# Altium footprint library mainLib.PcbLib: 169 footprints (part 8 of 11)
Each footprint in its own frame and in the unit in brackets; x right, y up, seen from the top. Pads: shape width x height; smd on the part's side, far side on the other; paste and mask are expansions set on the pad; w line width, h text height; cw(c..) or ccw(c..) is an arc to the next point about the centre after c.
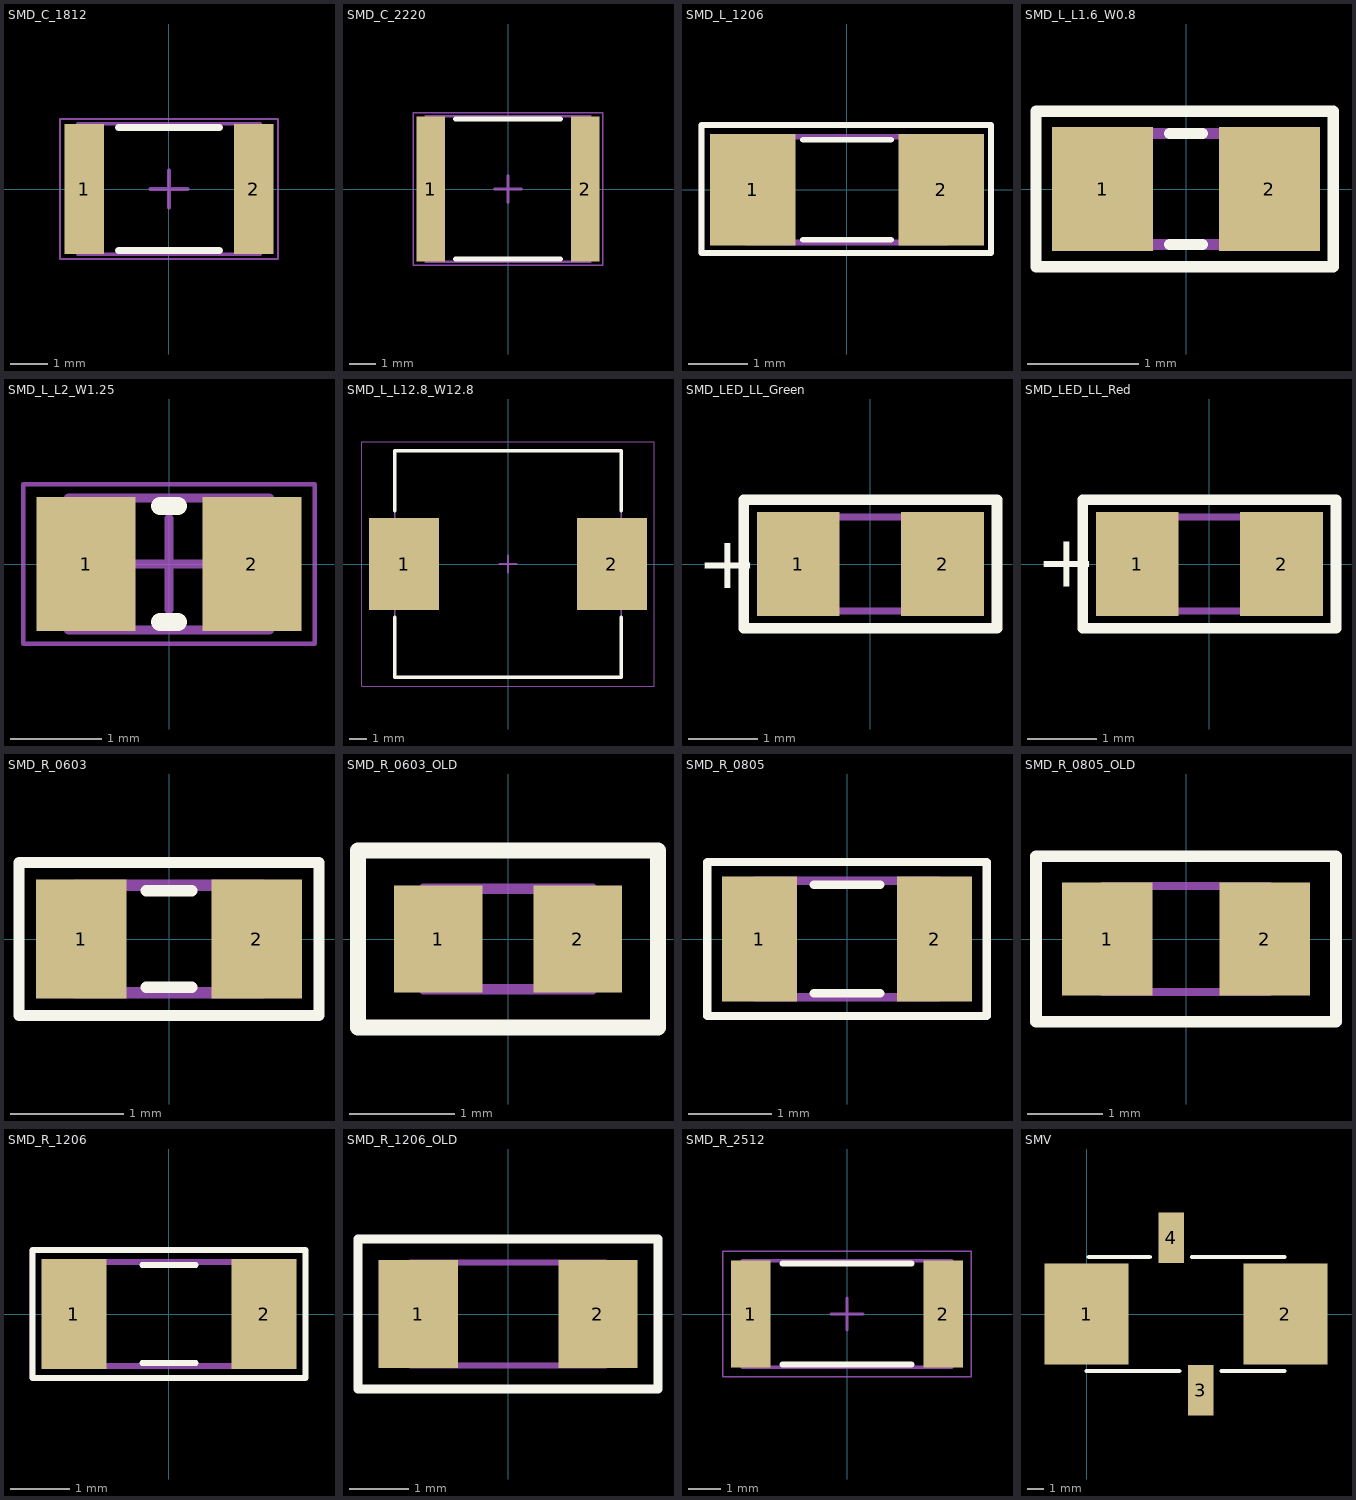
[diagram p7: the footprints below, top view; thin cyan lines are the x and y axes]

## SMD_C_1812 [mm] "Chip Capacitor, 2-Leads, Body 4,50x3,20mm, IPC Medium Density"
height 2
pads (2):
  rect 1.05x3.5 smd: 1(-2.275,0) 2(2.275,0)
Top Overlay:
  lines w0.2: -1.35,-1.65 1.35,-1.65 ; -1.35,1.65 1.35,1.65
Mechanical 13:
  lines w0.1: -2.45,-1.75 -2.45,1.75 2.45,1.75 2.45,-1.75 -2.45,-1.75
Mechanical 15:
  lines w0.05: -2.925,-1.875 -2.925,1.875 2.925,1.875 2.925,-1.875 -2.925,-1.875
  lines w0.1: -0.5,0 0.5,0 ; 0,-0.5 0,0.5
3D body "SMD_C_1812.step": height 2, standoff 0, extent -2.45,-1.75 2.45,1.75

## SMD_C_2220 [mm]
height 2
pads (2):
  rect 1.05x5.4 smd: 1(-2.875,0) 2(2.875,0)
Top Overlay:
  lines w0.2: -1.95,-2.6 1.95,-2.6 ; -1.95,2.6 1.95,2.6
Mechanical 13:
  lines w0.1: -3.05,-2.7 -3.05,2.7 3.05,2.7 3.05,-2.7 -3.05,-2.7
Mechanical 15:
  lines w0.05: -3.525,-2.825 -3.525,2.825 3.525,2.825 3.525,-2.825 -3.525,-2.825
  lines w0.1: -0.5,0 0.5,0 ; 0,-0.5 0,0.5
3D body "SMD_C_2220.step": height 2, standoff 0, extent -3.05,-2.7 3.05,2.7

## SMD_L_1206 [mm]
height 1.6
pads (2):
  rect 1.45x1.9 smd: 1(-1.6,0) 2(1.6,0)
Top Overlay:
  lines w0.1: -0.75,-0.85 0.75,-0.85 ; -0.75,0.85 0.75,0.85 ; -2.475,-1.075 -2.475,1.1 2.45,1.1 2.45,-1.075 -2.475,-1.075
Mechanical 13:
  lines w0.1: -1.7,-0.9 -1.7,0.9 1.7,0.9 1.7,-0.9 -1.7,-0.9
Mechanical 15:
  lines w0.05: -2.5,-1.075 -2.5,1.1 2.475,1.1 2.475,-1.075 -2.5,-1.075
3D body "SMD_C_1206.step": height 1.6, standoff 0, extent -1.7,-0.9 1.7,0.9

## SMD_L_L1.6_W0.8 [mm] "Chip Inductor, 2-Leads, Body 1,60x0,80mm, IPC Low Density"
height 0.8
pads (2):
  rect 0.91x1.12 smd: 1(-0.75,0) 2(0.75,0)
Top Overlay:
  lines w0.1: -0.15,-0.5 0.15,-0.5 ; -0.15,0.5 0.15,0.5 ; -1.35,-0.7 1.325,-0.7 1.325,0.7 -1.35,0.7 -1.35,-0.7
Mechanical 13:
  lines w0.1: -0.9,-0.5 -0.9,0.5 0.9,0.5 0.9,-0.5 -0.9,-0.5
Mechanical 15:
  lines w0.05: -1.35,-0.7 -1.35,0.7 1.35,0.7 1.35,-0.7 -1.35,-0.7
3D body: height 0.8, standoff 0, extent -0.55,-0.5 0.55,0.5
3D body: height 0.8, standoff 0, extent -0.9,-0.5 -0.55,0.5
3D body: height 0.8, standoff 0, extent 0.55,-0.5 0.9,0.5

## SMD_L_L2_W1.25 [mm]
height 0.85
pads (2):
  rect 1.09x1.47 smd: 1(-0.91,0) 2(0.91,0)
Top Overlay:
  lines w0.2: -0.1,-0.635 0.1,-0.635 ; -0.1,0.635 0.1,0.635
Mechanical 13:
  lines w0.1: -1.1,-0.725 -1.1,0.725 1.1,0.725 1.1,-0.725 -1.1,-0.725
Mechanical 15:
  lines w0.05: -1.6,-0.875 -1.6,0.875 1.6,0.875 1.6,-0.875 -1.6,-0.875
  lines w0.1: -0.5,0 0.5,0 ; 0,-0.5 0,0.5
3D body: height 0.85, standoff 0, extent -0.6,-0.725 0.6,0.725
3D body: height 0.85, standoff 0, extent -1.1,-0.725 -0.6,0.725
3D body: height 0.85, standoff 0, extent 0.6,-0.725 1.1,0.725

## SMD_L_L12.8_W12.8 [mil] "Precision Wire Wound Inductor, 2-Leads, Body 12,80x12,80mm, IPC Low Density"
height 314.96
pads (2):
  rect 155x205 smd: 1(-231.3,0) 2(231.3,0)
Top Overlay:
  lines w7.87: -251.97,-118.11 -251.97,-251.97 251.97,-251.97 251.97,-118.11 ; -251.97,118.11 -251.97,251.97 251.97,251.97 251.97,118.11
Mechanical 1:
  text "'.Designator'" at -253.94,290.35 h60
Mechanical 13:
  lines w3.94: -251.97,-251.97 251.97,-251.97 251.97,251.97 -251.97,251.97 -251.97,-251.97
Mechanical 15:
  lines w1.97: -325,-271.65 325,-271.65 325,271.65 -325,271.65 -325,-271.65
  lines w3.94: -19.68,0 19.69,0 ; 0,-19.68 0,19.68
3D body "INDP128128X80M.step": height 318.9, standoff 0, extent -255.91,-251.97 255.91,251.97

## SMD_LED_LL_Green [mil] "Chip Diode, 2-Leads, Body 2,00x1,25mm, IPC Low Density"
height 31.5
pads (2):
  rect 47x59 smd: 1(-41,0) 2(41,0)
Top Overlay:
  lines w6: -71.85,-36.42 -71.85,36.42 71.85,36.42 71.85,-36.42 -71.85,-36.42
  text "+" at -98.43,-13.78 h30
Mechanical 13:
  lines w3.94: -41.34,-26.57 -41.34,26.57 41.34,26.57 41.34,-26.57 -41.34,-26.57
3D body: height 31.5, standoff 0, extent -25.59,-26.57 25.59,26.58
3D body: height 31.5, standoff 0, extent -41.34,-26.57 -25.59,26.57
3D body: height 31.5, standoff 0, extent 25.59,-26.57 41.34,26.57

## SMD_LED_LL_Red [mil] "Chip Diode, 2-Leads, Body 2,00x1,25mm, IPC Low Density"
height 31.5
pads (2):
  rect 47x59 smd: 1(-41,0) 2(41,0)
Top Overlay:
  lines w6: -71.85,-36.42 -71.85,36.42 71.85,36.42 71.85,-36.42 -71.85,-36.42
  text "+" at -98.43,-12.8 h30
Mechanical 13:
  lines w3.94: -41.34,-26.57 -41.34,26.57 41.34,26.57 41.34,-26.57 -41.34,-26.57
3D body: height 31.5, standoff 0, extent -25.59,-26.57 25.59,26.58
3D body: height 31.5, standoff 0, extent -41.34,-26.57 -25.59,26.57
3D body: height 31.5, standoff 0, extent 25.59,-26.57 41.34,26.57

## SMD_R_0603 [mm]
height 0.5
pads (2):
  rect 0.8x1.05 smd: 1(-0.775,0) 2(0.775,0)
Top Overlay:
  lines w0.1: -0.2,-0.425 0.2,-0.425 ; -0.2,0.425 -0.1,0.425 0.1,0.425 0.2,0.425 ; -1.325,-0.675 1.325,-0.675 1.325,0.675 -1.325,0.675 -1.325,-0.675
Mechanical 13:
  lines w0.1: -0.825,-0.475 -0.825,0.475 0.825,0.475 0.825,-0.475 -0.825,-0.475
Mechanical 15:
  lines w0.05: -1.325,-0.675 -1.325,0.675 1.325,0.675 1.325,-0.675 -1.325,-0.675
3D body "SMD_R0603.step": height 0.5, standoff 0, extent -0.825,-0.475 0.825,0.475

## SMD_R_0603_OLD [mil] "Chip Resistor, 2-Leads, Body 1,55x0,85mm, IPC Low Density"
height 17.72
pads (2):
  rect 33x40 smd: 1(-26,0) 2(26,0)
Top Overlay:
  lines w6: -56,-33 56,-33 56,33 -56,33 -56,-33
Mechanical 13:
  lines w3.94: -31.5,-18.7 31.5,-18.7 31.5,18.7 -31.5,18.7 -31.5,-18.7
3D body "RESC1608X05M.step": height 17.72, standoff 0, extent -31.5,-18.7 31.5,18.7

## SMD_R_0805 [mm]
height 0.5
pads (2):
  rect 0.9x1.5 smd: 1(-1.05,0) 2(1.05,0)
Top Overlay:
  lines w0.1: -0.4,-0.65 0.4,-0.65 ; -0.4,0.65 0.4,0.65 ; -1.675,-0.925 1.675,-0.925 1.675,0.925 -1.675,0.925 -1.675,-0.925
Mechanical 13:
  lines w0.1: -1.1,-0.7 -1.1,0.7 1.1,0.7 1.1,-0.7 -1.1,-0.7
Mechanical 15:
  lines w0.05: -1.675,-0.925 -1.675,0.925 1.675,0.925 1.675,-0.925 -1.675,-0.925
3D body "SMD_R_0805.step": height 0.5, standoff 0, extent -1.1,-0.7 1.1,0.7

## SMD_R_0805_OLD [mil] "Chip Resistor, 2-Leads, Body 2,05x1,22mm, IPC Low Density"
height 17.72
pads (2):
  rect 47x59 smd: 1(-41,0) 2(41,0)
Top Overlay:
  lines w6: -78,-43 -78,43 78,43 78,-43 -78,-43
Mechanical 13:
  lines w3.94: -43.31,-27.56 -43.31,27.56 43.31,27.56 43.31,-27.56 -43.31,-27.56
3D body "RESC2112X05M.step": height 17.72, standoff 0, extent -43.31,-27.56 43.31,27.56

## SMD_R_1206 [mm]
height 0.6
pads (2):
  rect 1.1x1.85 smd: 1(-1.6,0) 2(1.6,0)
Top Overlay:
  lines w0.1: -0.45,-0.825 0.45,-0.825 ; -0.45,0.825 0.45,0.825 ; -2.3,-1.075 -2.3,1.075 2.3,1.075 2.3,-1.075 -2.3,-1.075
Mechanical 13:
  lines w0.1: -1.65,-0.875 -1.65,0.875 1.65,0.875 1.65,-0.875 -1.65,-0.875
Mechanical 15:
  lines w0.05: -2.325,-1.075 -2.325,1.075 2.3,1.075 2.3,-1.075 -2.325,-1.075
3D body "SMD_R_1206_1.step": height 0.6, standoff 0, extent -1.65,-0.875 1.65,0.875

## SMD_R_1206_OLD [mil] "Chip Resistor, 2-Leads, Body 3,15x1,60mm, IPC Low Density"
height 21.65
pads (2):
  rect 53x72 smd: 1(-60,0) 2(60,0)
Top Overlay:
  lines w6: -100,-50 -100,50 100,50 100,-50 -100,-50
Mechanical 13:
  lines w3.94: -64.96,-34.45 64.96,-34.45 64.96,34.45 -64.96,34.45 -64.96,-34.45
3D body "RESC3116X06M.step": height 21.65, standoff 0, extent -64.96,-34.45 64.96,34.45

## SMD_R_2512 [mm]
height 0.6
pads (2):
  rect 1.23x3.33 smd: 1(-2.985,0) 2(2.985,0)
Top Overlay:
  lines w0.2: -2,-1.565 2,-1.565 ; -2,1.565 2,1.565
Mechanical 13:
  lines w0.1: -3.25,-1.65 -3.25,1.65 3.25,1.65 3.25,-1.65 -3.25,-1.65
Mechanical 15:
  lines w0.05: -3.85,-1.95 -3.85,1.95 3.85,1.95 3.85,-1.95 -3.85,-1.95
  lines w0.1: -0.5,0 0.5,0 ; 0,-0.5 0,0.5
3D body "SMD_R_2512.step": height 0.6, standoff 0, extent -3.25,-1.65 3.25,1.65

## SMV [mil]
pads (4):
  rect 200x240 smd: 1(0,0) 2(472,0)
  rect 60x120 smd: 3(271,-181) 4(201,181)
Top Overlay:
  lines w10: 0,-135 220,-135 ; 5,135 150,135 ; 250,135 470,135 ; 320,-135 470,-135
3D body: height 0, standoff 0, extent -104,-245 576,245
3D body: height 0, standoff 0, extent -5,-140 475,140